# Altium footprint library ST封装.PcbLib: 1336 footprints (part 91 of 109)
Each footprint in its own frame and in the unit in brackets; x right, y up, seen from the top. Pads: shape width x height; smd on the part's side, far side on the other; paste and mask are expansions set on the pad; w line width, h text height; cw(c..) or ccw(c..) is an arc to the next point about the centre after c.
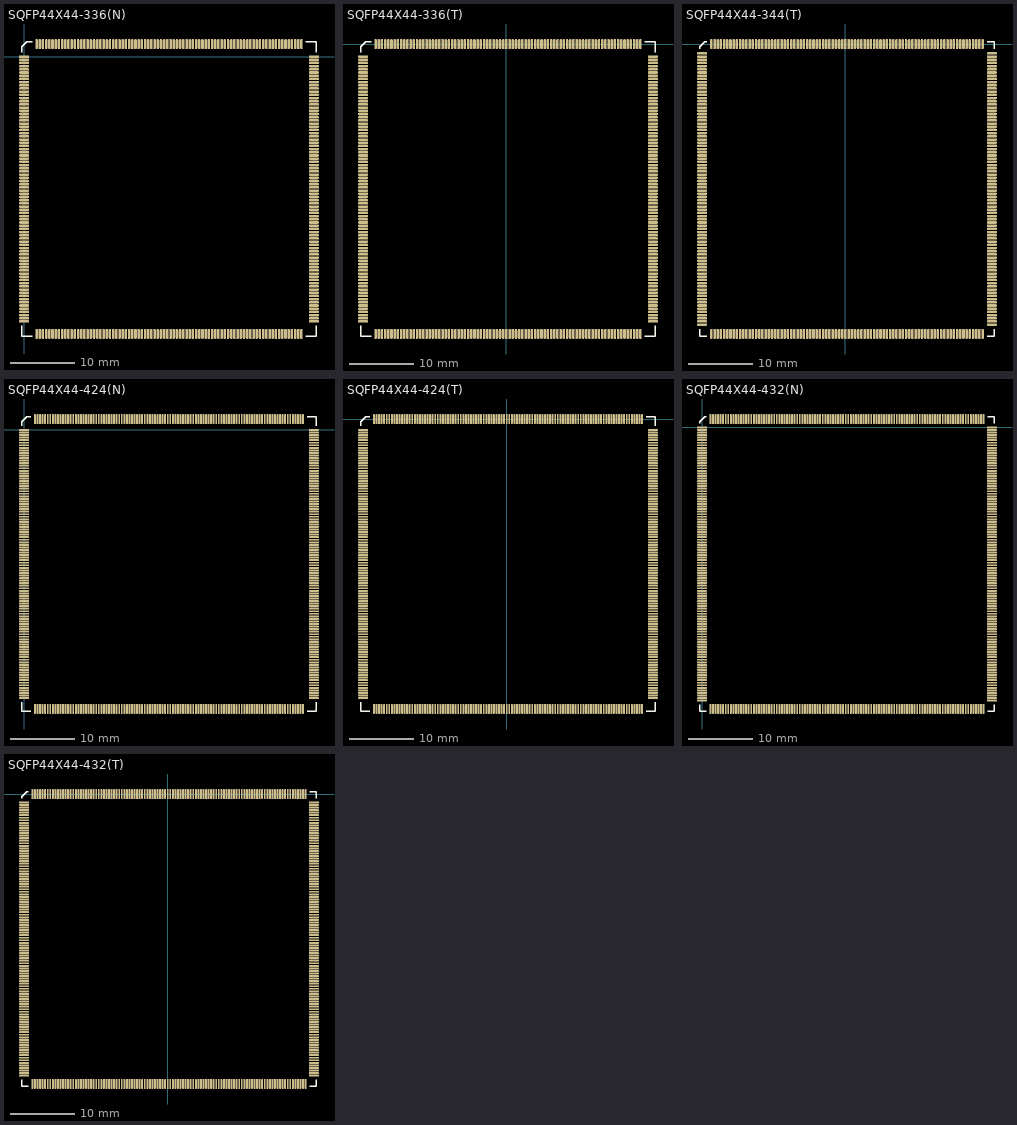
[diagram p90: the footprints below, top view; thin cyan lines are the x and y axes]

## SQFP44X44-336(N) [mm]
pads (336):
  rect 1.6x0.4 smd: 1(0,0)
  oval 1.6x0.4 smd: 2(0,-0.5) 3(0,-1) 4(0,-1.5) 5(0,-2) 6(0,-2.5) 7(0,-3) 8(0,-3.5) 9(0,-4) 10(0,-4.5) 11(0,-5) 12(0,-5.5) 13(0,-6) 14(0,-6.5) 15(0,-7) 16(0,-7.5) 17(0,-8) 18(0,-8.5) 19(0,-9) 20(0,-9.5) 21(0,-10) 22(0,-10.5) 23(0,-11) 24(0,-11.5) 25(0,-12) 26(0,-12.5) 27(0,-13) 28(0,-13.5) 29(0,-14) 30(0,-14.5) 31(0,-15) 32(0,-15.5) 33(0,-16) 34(0,-16.5) 35(0,-17) 36(0,-17.5) 37(0,-18) 38(0,-18.5) 39(0,-19) 40(0,-19.5) 41(0,-20) 42(0,-20.5) 43(0,-21) 44(0,-21.5) 45(0,-22) 46(0,-22.5) 47(0,-23) 48(0,-23.5) 49(0,-24) 50(0,-24.5) 51(0,-25) 52(0,-25.5) 53(0,-26) 54(0,-26.5) 55(0,-27) 56(0,-27.5) 57(0,-28) 58(0,-28.5) 59(0,-29) 60(0,-29.5) 61(0,-30) 62(0,-30.5) 63(0,-31) 64(0,-31.5) 65(0,-32) 66(0,-32.5) 67(0,-33) 68(0,-33.5) 69(0,-34) 70(0,-34.5) 71(0,-35) 72(0,-35.5) 73(0,-36) 74(0,-36.5) 75(0,-37) 76(0,-37.5) 77(0,-38) 78(0,-38.5) 79(0,-39) 80(0,-39.5) 81(0,-40) 82(0,-40.5) 83(0,-41) 84(0,-41.5) 169(45.4,-41.5) 170(45.4,-41) 171(45.4,-40.5) 172(45.4,-40) 173(45.4,-39.5) 174(45.4,-39) 175(45.4,-38.5) 176(45.4,-38) 177(45.4,-37.5) 178(45.4,-37) 179(45.4,-36.5) 180(45.4,-36) 181(45.4,-35.5) 182(45.4,-35) 183(45.4,-34.5) 184(45.4,-34) 185(45.4,-33.5) 186(45.4,-33) 187(45.4,-32.5) 188(45.4,-32) 189(45.4,-31.5) 190(45.4,-31) 191(45.4,-30.5) 192(45.4,-30) 193(45.4,-29.5) 194(45.4,-29) 195(45.4,-28.5) 196(45.4,-28) 197(45.4,-27.5) 198(45.4,-27) 199(45.4,-26.5) 200(45.4,-26) 201(45.4,-25.5) 202(45.4,-25) 203(45.4,-24.5) 204(45.4,-24) 205(45.4,-23.5) 206(45.4,-23) 207(45.4,-22.5) 208(45.4,-22) 209(45.4,-21.5) 210(45.4,-21) 211(45.4,-20.5) 212(45.4,-20) 213(45.4,-19.5) 214(45.4,-19) 215(45.4,-18.5) 216(45.4,-18) 217(45.4,-17.5) 218(45.4,-17) 219(45.4,-16.5) 220(45.4,-16) 221(45.4,-15.5) 222(45.4,-15) 223(45.4,-14.5) 224(45.4,-14) 225(45.4,-13.5) 226(45.4,-13) 227(45.4,-12.5) 228(45.4,-12) 229(45.4,-11.5) 230(45.4,-11) 231(45.4,-10.5) 232(45.4,-10) 233(45.4,-9.5) 234(45.4,-9) 235(45.4,-8.5) 236(45.4,-8) 237(45.4,-7.5) 238(45.4,-7) 239(45.4,-6.5) 240(45.4,-6) 241(45.4,-5.5) 242(45.4,-5) 243(45.4,-4.5) 244(45.4,-4) 245(45.4,-3.5) 246(45.4,-3) 247(45.4,-2.5) 248(45.4,-2) 249(45.4,-1.5) 250(45.4,-1) 251(45.4,-0.5) 252(45.4,0)
  oval 0.4x1.6 smd: 85(1.95,-43.45) 86(2.45,-43.45) 87(2.95,-43.45) 88(3.45,-43.45) 89(3.95,-43.45) 90(4.45,-43.45) 91(4.95,-43.45) 92(5.45,-43.45) 93(5.95,-43.45) 94(6.45,-43.45) 95(6.95,-43.45) 96(7.45,-43.45) 97(7.95,-43.45) 98(8.45,-43.45) 99(8.95,-43.45) 100(9.45,-43.45) 101(9.95,-43.45) 102(10.45,-43.45) 103(10.95,-43.45) 104(11.45,-43.45) 105(11.95,-43.45) 106(12.45,-43.45) 107(12.95,-43.45) 108(13.45,-43.45) 109(13.95,-43.45) 110(14.45,-43.45) 111(14.95,-43.45) 112(15.45,-43.45) 113(15.95,-43.45) 114(16.45,-43.45) 115(16.95,-43.45) 116(17.45,-43.45) 117(17.95,-43.45) 118(18.45,-43.45) 119(18.95,-43.45) 120(19.45,-43.45) 121(19.95,-43.45) 122(20.45,-43.45) 123(20.95,-43.45) 124(21.45,-43.45) 125(21.95,-43.45) 126(22.45,-43.45) 127(22.95,-43.45) 128(23.45,-43.45) 129(23.95,-43.45) 130(24.45,-43.45) 131(24.95,-43.45) 132(25.45,-43.45) 133(25.95,-43.45) 134(26.45,-43.45) 135(26.95,-43.45) 136(27.45,-43.45) 137(27.95,-43.45) 138(28.45,-43.45) 139(28.95,-43.45) 140(29.45,-43.45) 141(29.95,-43.45) 142(30.45,-43.45) 143(30.95,-43.45) 144(31.45,-43.45) 145(31.95,-43.45) 146(32.45,-43.45) 147(32.95,-43.45) 148(33.45,-43.45) 149(33.95,-43.45) 150(34.45,-43.45) 151(34.95,-43.45) 152(35.45,-43.45) 153(35.95,-43.45) 154(36.45,-43.45) 155(36.95,-43.45) 156(37.45,-43.45) 157(37.95,-43.45) 158(38.45,-43.45) 159(38.95,-43.45) 160(39.45,-43.45) 161(39.95,-43.45) 162(40.45,-43.45) 163(40.95,-43.45) 164(41.45,-43.45) 165(41.95,-43.45) 166(42.45,-43.45) 167(42.95,-43.45) 168(43.45,-43.45) 253(43.45,1.95) 254(42.95,1.95) 255(42.45,1.95) 256(41.95,1.95) 257(41.45,1.95) 258(40.95,1.95) 259(40.45,1.95) 260(39.95,1.95) 261(39.45,1.95) 262(38.95,1.95) 263(38.45,1.95) 264(37.95,1.95) 265(37.45,1.95) 266(36.95,1.95) 267(36.45,1.95) 268(35.95,1.95) 269(35.45,1.95) 270(34.95,1.95) 271(34.45,1.95) 272(33.95,1.95) 273(33.45,1.95) 274(32.95,1.95) 275(32.45,1.95) 276(31.95,1.95) 277(31.45,1.95) 278(30.95,1.95) 279(30.45,1.95) 280(29.95,1.95) 281(29.45,1.95) 282(28.95,1.95) 283(28.45,1.95) 284(27.95,1.95) 285(27.45,1.95) 286(26.95,1.95) 287(26.45,1.95) 288(25.95,1.95) 289(25.45,1.95) 290(24.95,1.95) 291(24.45,1.95) 292(23.95,1.95) 293(23.45,1.95) 294(22.95,1.95) 295(22.45,1.95) 296(21.95,1.95) 297(21.45,1.95) 298(20.95,1.95) 299(20.45,1.95) 300(19.95,1.95) 301(19.45,1.95) 302(18.95,1.95) 303(18.45,1.95) 304(17.95,1.95) 305(17.45,1.95) 306(16.95,1.95) 307(16.45,1.95) 308(15.95,1.95) 309(15.45,1.95) 310(14.95,1.95) 311(14.45,1.95) 312(13.95,1.95) 313(13.45,1.95) 314(12.95,1.95) 315(12.45,1.95) 316(11.95,1.95) 317(11.45,1.95) 318(10.95,1.95) 319(10.45,1.95) 320(9.95,1.95) 321(9.45,1.95) 322(8.95,1.95) 323(8.45,1.95) 324(7.95,1.95) 325(7.45,1.95) 326(6.95,1.95) 327(6.45,1.95) 328(5.95,1.95) 329(5.45,1.95) 330(4.95,1.95) 331(4.45,1.95) 332(3.95,1.95) 333(3.45,1.95) 334(2.95,1.95) 335(2.45,1.95) 336(1.95,1.95)
Top Overlay:
  lines w0.2: -0.4,-42.2 -0.4,-43.85 1.25,-43.85 ; -0.4,0.7 -0.4,1.55 0.4,2.35 1.25,2.35 ; 44.15,-43.85 45.8,-43.85 45.8,-42.2 ; 44.15,2.35 45.8,2.35 45.8,0.7

## SQFP44X44-336(T) [mm]
pads (336):
  rect 0.4x1.6 smd: 1(0,0)
  oval 0.4x1.6 smd: 2(-0.5,0) 3(-1,0) 4(-1.5,0) 5(-2,0) 6(-2.5,0) 7(-3,0) 8(-3.5,0) 9(-4,0) 10(-4.5,0) 11(-5,0) 12(-5.5,0) 13(-6,0) 14(-6.5,0) 15(-7,0) 16(-7.5,0) 17(-8,0) 18(-8.5,0) 19(-9,0) 20(-9.5,0) 21(-10,0) 22(-10.5,0) 23(-11,0) 24(-11.5,0) 25(-12,0) 26(-12.5,0) 27(-13,0) 28(-13.5,0) 29(-14,0) 30(-14.5,0) 31(-15,0) 32(-15.5,0) 33(-16,0) 34(-16.5,0) 35(-17,0) 36(-17.5,0) 37(-18,0) 38(-18.5,0) 39(-19,0) 40(-19.5,0) 41(-20,0) 42(-20.5,0) 127(-20.5,-45.4) 128(-20,-45.4) 129(-19.5,-45.4) 130(-19,-45.4) 131(-18.5,-45.4) 132(-18,-45.4) 133(-17.5,-45.4) 134(-17,-45.4) 135(-16.5,-45.4) 136(-16,-45.4) 137(-15.5,-45.4) 138(-15,-45.4) 139(-14.5,-45.4) 140(-14,-45.4) 141(-13.5,-45.4) 142(-13,-45.4) 143(-12.5,-45.4) 144(-12,-45.4) 145(-11.5,-45.4) 146(-11,-45.4) 147(-10.5,-45.4) 148(-10,-45.4) 149(-9.5,-45.4) 150(-9,-45.4) 151(-8.5,-45.4) 152(-8,-45.4) 153(-7.5,-45.4) 154(-7,-45.4) 155(-6.5,-45.4) 156(-6,-45.4) 157(-5.5,-45.4) 158(-5,-45.4) 159(-4.5,-45.4) 160(-4,-45.4) 161(-3.5,-45.4) 162(-3,-45.4) 163(-2.5,-45.4) 164(-2,-45.4) 165(-1.5,-45.4) 166(-1,-45.4) 167(-0.5,-45.4) 168(0,-45.4) 169(0.5,-45.4) 170(1,-45.4) 171(1.5,-45.4) 172(2,-45.4) 173(2.5,-45.4) 174(3,-45.4) 175(3.5,-45.4) 176(4,-45.4) 177(4.5,-45.4) 178(5,-45.4) 179(5.5,-45.4) 180(6,-45.4) 181(6.5,-45.4) 182(7,-45.4) 183(7.5,-45.4) 184(8,-45.4) 185(8.5,-45.4) 186(9,-45.4) 187(9.5,-45.4) 188(10,-45.4) 189(10.5,-45.4) 190(11,-45.4) 191(11.5,-45.4) 192(12,-45.4) 193(12.5,-45.4) 194(13,-45.4) 195(13.5,-45.4) 196(14,-45.4) 197(14.5,-45.4) 198(15,-45.4) 199(15.5,-45.4) 200(16,-45.4) 201(16.5,-45.4) 202(17,-45.4) 203(17.5,-45.4) 204(18,-45.4) 205(18.5,-45.4) 206(19,-45.4) 207(19.5,-45.4) 208(20,-45.4) 209(20.5,-45.4) 210(21,-45.4) 295(21,0) 296(20.5,0) 297(20,0) 298(19.5,0) 299(19,0) 300(18.5,0) 301(18,0) 302(17.5,0) 303(17,0) 304(16.5,0) 305(16,0) 306(15.5,0) 307(15,0) 308(14.5,0) 309(14,0) 310(13.5,0) 311(13,0) 312(12.5,0) 313(12,0) 314(11.5,0) 315(11,0) 316(10.5,0) 317(10,0) 318(9.5,0) 319(9,0) 320(8.5,0) 321(8,0) 322(7.5,0) 323(7,0) 324(6.5,0) 325(6,0) 326(5.5,0) 327(5,0) 328(4.5,0) 329(4,0) 330(3.5,0) 331(3,0) 332(2.5,0) 333(2,0) 334(1.5,0) 335(1,0) 336(0.5,0)
  oval 1.6x0.4 smd: 43(-22.45,-1.95) 44(-22.45,-2.45) 45(-22.45,-2.95) 46(-22.45,-3.45) 47(-22.45,-3.95) 48(-22.45,-4.45) 49(-22.45,-4.95) 50(-22.45,-5.45) 51(-22.45,-5.95) 52(-22.45,-6.45) 53(-22.45,-6.95) 54(-22.45,-7.45) 55(-22.45,-7.95) 56(-22.45,-8.45) 57(-22.45,-8.95) 58(-22.45,-9.45) 59(-22.45,-9.95) 60(-22.45,-10.45) 61(-22.45,-10.95) 62(-22.45,-11.45) 63(-22.45,-11.95) 64(-22.45,-12.45) 65(-22.45,-12.95) 66(-22.45,-13.45) 67(-22.45,-13.95) 68(-22.45,-14.45) 69(-22.45,-14.95) 70(-22.45,-15.45) 71(-22.45,-15.95) 72(-22.45,-16.45) 73(-22.45,-16.95) 74(-22.45,-17.45) 75(-22.45,-17.95) 76(-22.45,-18.45) 77(-22.45,-18.95) 78(-22.45,-19.45) 79(-22.45,-19.95) 80(-22.45,-20.45) 81(-22.45,-20.95) 82(-22.45,-21.45) 83(-22.45,-21.95) 84(-22.45,-22.45) 85(-22.45,-22.95) 86(-22.45,-23.45) 87(-22.45,-23.95) 88(-22.45,-24.45) 89(-22.45,-24.95) 90(-22.45,-25.45) 91(-22.45,-25.95) 92(-22.45,-26.45) 93(-22.45,-26.95) 94(-22.45,-27.45) 95(-22.45,-27.95) 96(-22.45,-28.45) 97(-22.45,-28.95) 98(-22.45,-29.45) 99(-22.45,-29.95) 100(-22.45,-30.45) 101(-22.45,-30.95) 102(-22.45,-31.45) 103(-22.45,-31.95) 104(-22.45,-32.45) 105(-22.45,-32.95) 106(-22.45,-33.45) 107(-22.45,-33.95) 108(-22.45,-34.45) 109(-22.45,-34.95) 110(-22.45,-35.45) 111(-22.45,-35.95) 112(-22.45,-36.45) 113(-22.45,-36.95) 114(-22.45,-37.45) 115(-22.45,-37.95) 116(-22.45,-38.45) 117(-22.45,-38.95) 118(-22.45,-39.45) 119(-22.45,-39.95) 120(-22.45,-40.45) 121(-22.45,-40.95) 122(-22.45,-41.45) 123(-22.45,-41.95) 124(-22.45,-42.45) 125(-22.45,-42.95) 126(-22.45,-43.45) 211(22.95,-43.45) 212(22.95,-42.95) 213(22.95,-42.45) 214(22.95,-41.95) 215(22.95,-41.45) 216(22.95,-40.95) 217(22.95,-40.45) 218(22.95,-39.95) 219(22.95,-39.45) 220(22.95,-38.95) 221(22.95,-38.45) 222(22.95,-37.95) 223(22.95,-37.45) 224(22.95,-36.95) 225(22.95,-36.45) 226(22.95,-35.95) 227(22.95,-35.45) 228(22.95,-34.95) 229(22.95,-34.45) 230(22.95,-33.95) 231(22.95,-33.45) 232(22.95,-32.95) 233(22.95,-32.45) 234(22.95,-31.95) 235(22.95,-31.45) 236(22.95,-30.95) 237(22.95,-30.45) 238(22.95,-29.95) 239(22.95,-29.45) 240(22.95,-28.95) 241(22.95,-28.45) 242(22.95,-27.95) 243(22.95,-27.45) 244(22.95,-26.95) 245(22.95,-26.45) 246(22.95,-25.95) 247(22.95,-25.45) 248(22.95,-24.95) 249(22.95,-24.45) 250(22.95,-23.95) 251(22.95,-23.45) 252(22.95,-22.95) 253(22.95,-22.45) 254(22.95,-21.95) 255(22.95,-21.45) 256(22.95,-20.95) 257(22.95,-20.45) 258(22.95,-19.95) 259(22.95,-19.45) 260(22.95,-18.95) 261(22.95,-18.45) 262(22.95,-17.95) 263(22.95,-17.45) 264(22.95,-16.95) 265(22.95,-16.45) 266(22.95,-15.95) 267(22.95,-15.45) 268(22.95,-14.95) 269(22.95,-14.45) 270(22.95,-13.95) 271(22.95,-13.45) 272(22.95,-12.95) 273(22.95,-12.45) 274(22.95,-11.95) 275(22.95,-11.45) 276(22.95,-10.95) 277(22.95,-10.45) 278(22.95,-9.95) 279(22.95,-9.45) 280(22.95,-8.95) 281(22.95,-8.45) 282(22.95,-7.95) 283(22.95,-7.45) 284(22.95,-6.95) 285(22.95,-6.45) 286(22.95,-5.95) 287(22.95,-5.45) 288(22.95,-4.95) 289(22.95,-4.45) 290(22.95,-3.95) 291(22.95,-3.45) 292(22.95,-2.95) 293(22.95,-2.45) 294(22.95,-1.95)
Top Overlay:
  lines w0.2: -22.85,-44.15 -22.85,-45.8 -21.2,-45.8 ; -22.85,-1.25 -22.85,-0.4 -22.05,0.4 -21.2,0.4 ; 21.7,-45.8 23.35,-45.8 23.35,-44.15 ; 21.7,0.4 23.35,0.4 23.35,-1.25

## SQFP44X44-344(T) [mm]
pads (344):
  rect 0.4x1.6 smd: 1(0,0)
  oval 0.4x1.6 smd: 2(-0.5,0) 3(-1,0) 4(-1.5,0) 5(-2,0) 6(-2.5,0) 7(-3,0) 8(-3.5,0) 9(-4,0) 10(-4.5,0) 11(-5,0) 12(-5.5,0) 13(-6,0) 14(-6.5,0) 15(-7,0) 16(-7.5,0) 17(-8,0) 18(-8.5,0) 19(-9,0) 20(-9.5,0) 21(-10,0) 22(-10.5,0) 23(-11,0) 24(-11.5,0) 25(-12,0) 26(-12.5,0) 27(-13,0) 28(-13.5,0) 29(-14,0) 30(-14.5,0) 31(-15,0) 32(-15.5,0) 33(-16,0) 34(-16.5,0) 35(-17,0) 36(-17.5,0) 37(-18,0) 38(-18.5,0) 39(-19,0) 40(-19.5,0) 41(-20,0) 42(-20.5,0) 43(-21,0) 130(-21,-45.4) 131(-20.5,-45.4) 132(-20,-45.4) 133(-19.5,-45.4) 134(-19,-45.4) 135(-18.5,-45.4) 136(-18,-45.4) 137(-17.5,-45.4) 138(-17,-45.4) 139(-16.5,-45.4) 140(-16,-45.4) 141(-15.5,-45.4) 142(-15,-45.4) 143(-14.5,-45.4) 144(-14,-45.4) 145(-13.5,-45.4) 146(-13,-45.4) 147(-12.5,-45.4) 148(-12,-45.4) 149(-11.5,-45.4) 150(-11,-45.4) 151(-10.5,-45.4) 152(-10,-45.4) 153(-9.5,-45.4) 154(-9,-45.4) 155(-8.5,-45.4) 156(-8,-45.4) 157(-7.5,-45.4) 158(-7,-45.4) 159(-6.5,-45.4) 160(-6,-45.4) 161(-5.5,-45.4) 162(-5,-45.4) 163(-4.5,-45.4) 164(-4,-45.4) 165(-3.5,-45.4) 166(-3,-45.4) 167(-2.5,-45.4) 168(-2,-45.4) 169(-1.5,-45.4) 170(-1,-45.4) 171(-0.5,-45.4) 172(0,-45.4) 173(0.5,-45.4) 174(1,-45.4) 175(1.5,-45.4) 176(2,-45.4) 177(2.5,-45.4) 178(3,-45.4) 179(3.5,-45.4) 180(4,-45.4) 181(4.5,-45.4) 182(5,-45.4) 183(5.5,-45.4) 184(6,-45.4) 185(6.5,-45.4) 186(7,-45.4) 187(7.5,-45.4) 188(8,-45.4) 189(8.5,-45.4) 190(9,-45.4) 191(9.5,-45.4) 192(10,-45.4) 193(10.5,-45.4) 194(11,-45.4) 195(11.5,-45.4) 196(12,-45.4) 197(12.5,-45.4) 198(13,-45.4) 199(13.5,-45.4) 200(14,-45.4) 201(14.5,-45.4) 202(15,-45.4) 203(15.5,-45.4) 204(16,-45.4) 205(16.5,-45.4) 206(17,-45.4) 207(17.5,-45.4) 208(18,-45.4) 209(18.5,-45.4) 210(19,-45.4) 211(19.5,-45.4) 212(20,-45.4) 213(20.5,-45.4) 214(21,-45.4) 215(21.5,-45.4) 302(21.5,0) 303(21,0) 304(20.5,0) 305(20,0) 306(19.5,0) 307(19,0) 308(18.5,0) 309(18,0) 310(17.5,0) 311(17,0) 312(16.5,0) 313(16,0) 314(15.5,0) 315(15,0) 316(14.5,0) 317(14,0) 318(13.5,0) 319(13,0) 320(12.5,0) 321(12,0) 322(11.5,0) 323(11,0) 324(10.5,0) 325(10,0) 326(9.5,0) 327(9,0) 328(8.5,0) 329(8,0) 330(7.5,0) 331(7,0) 332(6.5,0) 333(6,0) 334(5.5,0) 335(5,0) 336(4.5,0) 337(4,0) 338(3.5,0) 339(3,0) 340(2.5,0) 341(2,0) 342(1.5,0) 343(1,0) 344(0.5,0)
  oval 1.6x0.4 smd: 44(-22.45,-1.45) 45(-22.45,-1.95) 46(-22.45,-2.45) 47(-22.45,-2.95) 48(-22.45,-3.45) 49(-22.45,-3.95) 50(-22.45,-4.45) 51(-22.45,-4.95) 52(-22.45,-5.45) 53(-22.45,-5.95) 54(-22.45,-6.45) 55(-22.45,-6.95) 56(-22.45,-7.45) 57(-22.45,-7.95) 58(-22.45,-8.45) 59(-22.45,-8.95) 60(-22.45,-9.45) 61(-22.45,-9.95) 62(-22.45,-10.45) 63(-22.45,-10.95) 64(-22.45,-11.45) 65(-22.45,-11.95) 66(-22.45,-12.45) 67(-22.45,-12.95) 68(-22.45,-13.45) 69(-22.45,-13.95) 70(-22.45,-14.45) 71(-22.45,-14.95) 72(-22.45,-15.45) 73(-22.45,-15.95) 74(-22.45,-16.45) 75(-22.45,-16.95) 76(-22.45,-17.45) 77(-22.45,-17.95) 78(-22.45,-18.45) 79(-22.45,-18.95) 80(-22.45,-19.45) 81(-22.45,-19.95) 82(-22.45,-20.45) 83(-22.45,-20.95) 84(-22.45,-21.45) 85(-22.45,-21.95) 86(-22.45,-22.45) 87(-22.45,-22.95) 88(-22.45,-23.45) 89(-22.45,-23.95) 90(-22.45,-24.45) 91(-22.45,-24.95) 92(-22.45,-25.45) 93(-22.45,-25.95) 94(-22.45,-26.45) 95(-22.45,-26.95) 96(-22.45,-27.45) 97(-22.45,-27.95) 98(-22.45,-28.45) 99(-22.45,-28.95) 100(-22.45,-29.45) 101(-22.45,-29.95) 102(-22.45,-30.45) 103(-22.45,-30.95) 104(-22.45,-31.45) 105(-22.45,-31.95) 106(-22.45,-32.45) 107(-22.45,-32.95) 108(-22.45,-33.45) 109(-22.45,-33.95) 110(-22.45,-34.45) 111(-22.45,-34.95) 112(-22.45,-35.45) 113(-22.45,-35.95) 114(-22.45,-36.45) 115(-22.45,-36.95) 116(-22.45,-37.45) 117(-22.45,-37.95) 118(-22.45,-38.45) 119(-22.45,-38.95) 120(-22.45,-39.45) 121(-22.45,-39.95) 122(-22.45,-40.45) 123(-22.45,-40.95) 124(-22.45,-41.45) 125(-22.45,-41.95) 126(-22.45,-42.45) 127(-22.45,-42.95) 128(-22.45,-43.45) 129(-22.45,-43.95) 216(22.95,-43.95) 217(22.95,-43.45) 218(22.95,-42.95) 219(22.95,-42.45) 220(22.95,-41.95) 221(22.95,-41.45) 222(22.95,-40.95) 223(22.95,-40.45) 224(22.95,-39.95) 225(22.95,-39.45) 226(22.95,-38.95) 227(22.95,-38.45) 228(22.95,-37.95) 229(22.95,-37.45) 230(22.95,-36.95) 231(22.95,-36.45) 232(22.95,-35.95) 233(22.95,-35.45) 234(22.95,-34.95) 235(22.95,-34.45) 236(22.95,-33.95) 237(22.95,-33.45) 238(22.95,-32.95) 239(22.95,-32.45) 240(22.95,-31.95) 241(22.95,-31.45) 242(22.95,-30.95) 243(22.95,-30.45) 244(22.95,-29.95) 245(22.95,-29.45) 246(22.95,-28.95) 247(22.95,-28.45) 248(22.95,-27.95) 249(22.95,-27.45) 250(22.95,-26.95) 251(22.95,-26.45) 252(22.95,-25.95) 253(22.95,-25.45) 254(22.95,-24.95) 255(22.95,-24.45) 256(22.95,-23.95) 257(22.95,-23.45) 258(22.95,-22.95) 259(22.95,-22.45) 260(22.95,-21.95) 261(22.95,-21.45) 262(22.95,-20.95) 263(22.95,-20.45) 264(22.95,-19.95) 265(22.95,-19.45) 266(22.95,-18.95) 267(22.95,-18.45) 268(22.95,-17.95) 269(22.95,-17.45) 270(22.95,-16.95) 271(22.95,-16.45) 272(22.95,-15.95) 273(22.95,-15.45) 274(22.95,-14.95) 275(22.95,-14.45) 276(22.95,-13.95) 277(22.95,-13.45) 278(22.95,-12.95) 279(22.95,-12.45) 280(22.95,-11.95) 281(22.95,-11.45) 282(22.95,-10.95) 283(22.95,-10.45) 284(22.95,-9.95) 285(22.95,-9.45) 286(22.95,-8.95) 287(22.95,-8.45) 288(22.95,-7.95) 289(22.95,-7.45) 290(22.95,-6.95) 291(22.95,-6.45) 292(22.95,-5.95) 293(22.95,-5.45) 294(22.95,-4.95) 295(22.95,-4.45) 296(22.95,-3.95) 297(22.95,-3.45) 298(22.95,-2.95) 299(22.95,-2.45) 300(22.95,-1.95) 301(22.95,-1.45)
Top Overlay:
  lines w0.2: -22.85,-44.65 -22.85,-45.8 -21.7,-45.8 ; -22.85,-0.75 -22.85,-0.4 -22.05,0.4 -21.7,0.4 ; 22.2,-45.8 23.35,-45.8 23.35,-44.65 ; 22.2,0.4 23.35,0.4 23.35,-0.75

## SQFP44X44-424(N) [mm]
pads (424):
  rect 1.6x0.3 smd: 1(0,0)
  oval 1.6x0.3 smd: 2(0,-0.4) 3(0,-0.8) 4(0,-1.2) 5(0,-1.6) 6(0,-2) 7(0,-2.4) 8(0,-2.8) 9(0,-3.2) 10(0,-3.6) 11(0,-4) 12(0,-4.4) 13(0,-4.8) 14(0,-5.2) 15(0,-5.6) 16(0,-6) 17(0,-6.4) 18(0,-6.8) 19(0,-7.2) 20(0,-7.6) 21(0,-8) 22(0,-8.4) 23(0,-8.8) 24(0,-9.2) 25(0,-9.6) 26(0,-10) 27(0,-10.4) 28(0,-10.8) 29(0,-11.2) 30(0,-11.6) 31(0,-12) 32(0,-12.4) 33(0,-12.8) 34(0,-13.2) 35(0,-13.6) 36(0,-14) 37(0,-14.4) 38(0,-14.8) 39(0,-15.2) 40(0,-15.6) 41(0,-16) 42(0,-16.4) 43(0,-16.8) 44(0,-17.2) 45(0,-17.6) 46(0,-18) 47(0,-18.4) 48(0,-18.8) 49(0,-19.2) 50(0,-19.6) 51(0,-20) 52(0,-20.4) 53(0,-20.8) 54(0,-21.2) 55(0,-21.6) 56(0,-22) 57(0,-22.4) 58(0,-22.8) 59(0,-23.2) 60(0,-23.6) 61(0,-24) 62(0,-24.4) 63(0,-24.8) 64(0,-25.2) 65(0,-25.6) 66(0,-26) 67(0,-26.4) 68(0,-26.8) 69(0,-27.2) 70(0,-27.6) 71(0,-28) 72(0,-28.4) 73(0,-28.8) 74(0,-29.2) 75(0,-29.6) 76(0,-30) 77(0,-30.4) 78(0,-30.8) 79(0,-31.2) 80(0,-31.6) 81(0,-32) 82(0,-32.4) 83(0,-32.8) 84(0,-33.2) 85(0,-33.6) 86(0,-34) 87(0,-34.4) 88(0,-34.8) 89(0,-35.2) 90(0,-35.6) 91(0,-36) 92(0,-36.4) 93(0,-36.8) 94(0,-37.2) 95(0,-37.6) 96(0,-38) 97(0,-38.4) 98(0,-38.8) 99(0,-39.2) 100(0,-39.6) 101(0,-40) 102(0,-40.4) 103(0,-40.8) 104(0,-41.2) 105(0,-41.6) 106(0,-42) 213(45.4,-42) 214(45.4,-41.6) 215(45.4,-41.2) 216(45.4,-40.8) 217(45.4,-40.4) 218(45.4,-40) 219(45.4,-39.6) 220(45.4,-39.2) 221(45.4,-38.8) 222(45.4,-38.4) 223(45.4,-38) 224(45.4,-37.6) 225(45.4,-37.2) 226(45.4,-36.8) 227(45.4,-36.4) 228(45.4,-36) 229(45.4,-35.6) 230(45.4,-35.2) 231(45.4,-34.8) 232(45.4,-34.4) 233(45.4,-34) 234(45.4,-33.6) 235(45.4,-33.2) 236(45.4,-32.8) 237(45.4,-32.4) 238(45.4,-32) 239(45.4,-31.6) 240(45.4,-31.2) 241(45.4,-30.8) 242(45.4,-30.4) 243(45.4,-30) 244(45.4,-29.6) 245(45.4,-29.2) 246(45.4,-28.8) 247(45.4,-28.4) 248(45.4,-28) 249(45.4,-27.6) 250(45.4,-27.2) 251(45.4,-26.8) 252(45.4,-26.4) 253(45.4,-26) 254(45.4,-25.6) 255(45.4,-25.2) 256(45.4,-24.8) 257(45.4,-24.4) 258(45.4,-24) 259(45.4,-23.6) 260(45.4,-23.2) 261(45.4,-22.8) 262(45.4,-22.4) 263(45.4,-22) 264(45.4,-21.6) 265(45.4,-21.2) 266(45.4,-20.8) 267(45.4,-20.4) 268(45.4,-20) 269(45.4,-19.6) 270(45.4,-19.2) 271(45.4,-18.8) 272(45.4,-18.4) 273(45.4,-18) 274(45.4,-17.6) 275(45.4,-17.2) 276(45.4,-16.8) 277(45.4,-16.4) 278(45.4,-16) 279(45.4,-15.6) 280(45.4,-15.2) 281(45.4,-14.8) 282(45.4,-14.4) 283(45.4,-14) 284(45.4,-13.6) 285(45.4,-13.2) 286(45.4,-12.8) 287(45.4,-12.4) 288(45.4,-12) 289(45.4,-11.6) 290(45.4,-11.2) 291(45.4,-10.8) 292(45.4,-10.4) 293(45.4,-10) 294(45.4,-9.6) 295(45.4,-9.2) 296(45.4,-8.8) 297(45.4,-8.4) 298(45.4,-8) 299(45.4,-7.6) 300(45.4,-7.2) 301(45.4,-6.8) 302(45.4,-6.4) 303(45.4,-6) 304(45.4,-5.6) 305(45.4,-5.2) 306(45.4,-4.8) 307(45.4,-4.4) 308(45.4,-4) 309(45.4,-3.6) 310(45.4,-3.2) 311(45.4,-2.8) 312(45.4,-2.4) 313(45.4,-2) 314(45.4,-1.6) 315(45.4,-1.2) 316(45.4,-0.8) 317(45.4,-0.4) 318(45.4,0)
  oval 0.3x1.6 smd: 107(1.7,-43.7) 108(2.1,-43.7) 109(2.5,-43.7) 110(2.9,-43.7) 111(3.3,-43.7) 112(3.7,-43.7) 113(4.1,-43.7) 114(4.5,-43.7) 115(4.9,-43.7) 116(5.3,-43.7) 117(5.7,-43.7) 118(6.1,-43.7) 119(6.5,-43.7) 120(6.9,-43.7) 121(7.3,-43.7) 122(7.7,-43.7) 123(8.1,-43.7) 124(8.5,-43.7) 125(8.9,-43.7) 126(9.3,-43.7) 127(9.7,-43.7) 128(10.1,-43.7) 129(10.5,-43.7) 130(10.9,-43.7) 131(11.3,-43.7) 132(11.7,-43.7) 133(12.1,-43.7) 134(12.5,-43.7) 135(12.9,-43.7) 136(13.3,-43.7) 137(13.7,-43.7) 138(14.1,-43.7) 139(14.5,-43.7) 140(14.9,-43.7) 141(15.3,-43.7) 142(15.7,-43.7) 143(16.1,-43.7) 144(16.5,-43.7) 145(16.9,-43.7) 146(17.3,-43.7) 147(17.7,-43.7) 148(18.1,-43.7) 149(18.5,-43.7) 150(18.9,-43.7) 151(19.3,-43.7) 152(19.7,-43.7) 153(20.1,-43.7) 154(20.5,-43.7) 155(20.9,-43.7) 156(21.3,-43.7) 157(21.7,-43.7) 158(22.1,-43.7) 159(22.5,-43.7) 160(22.9,-43.7) 161(23.3,-43.7) 162(23.7,-43.7) 163(24.1,-43.7) 164(24.5,-43.7) 165(24.9,-43.7) 166(25.3,-43.7) 167(25.7,-43.7) 168(26.1,-43.7) 169(26.5,-43.7) 170(26.9,-43.7) 171(27.3,-43.7) 172(27.7,-43.7) 173(28.1,-43.7) 174(28.5,-43.7) 175(28.9,-43.7) 176(29.3,-43.7) 177(29.7,-43.7) 178(30.1,-43.7) 179(30.5,-43.7) 180(30.9,-43.7) 181(31.3,-43.7) 182(31.7,-43.7) 183(32.1,-43.7) 184(32.5,-43.7) 185(32.9,-43.7) 186(33.3,-43.7) 187(33.7,-43.7) 188(34.1,-43.7) 189(34.5,-43.7) 190(34.9,-43.7) 191(35.3,-43.7) 192(35.7,-43.7) 193(36.1,-43.7) 194(36.5,-43.7) 195(36.9,-43.7) 196(37.3,-43.7) 197(37.7,-43.7) 198(38.1,-43.7) 199(38.5,-43.7) 200(38.9,-43.7) 201(39.3,-43.7) 202(39.7,-43.7) 203(40.1,-43.7) 204(40.5,-43.7) 205(40.9,-43.7) 206(41.3,-43.7) 207(41.7,-43.7) 208(42.1,-43.7) 209(42.5,-43.7) 210(42.9,-43.7) 211(43.3,-43.7) 212(43.7,-43.7) 319(43.7,1.7) 320(43.3,1.7) 321(42.9,1.7) 322(42.5,1.7) 323(42.1,1.7) 324(41.7,1.7) 325(41.3,1.7) 326(40.9,1.7) 327(40.5,1.7) 328(40.1,1.7) 329(39.7,1.7) 330(39.3,1.7) 331(38.9,1.7) 332(38.5,1.7) 333(38.1,1.7) 334(37.7,1.7) 335(37.3,1.7) 336(36.9,1.7) 337(36.5,1.7) 338(36.1,1.7) 339(35.7,1.7) 340(35.3,1.7) 341(34.9,1.7) 342(34.5,1.7) 343(34.1,1.7) 344(33.7,1.7) 345(33.3,1.7) 346(32.9,1.7) 347(32.5,1.7) 348(32.1,1.7) 349(31.7,1.7) 350(31.3,1.7) 351(30.9,1.7) 352(30.5,1.7) 353(30.1,1.7) 354(29.7,1.7) 355(29.3,1.7) 356(28.9,1.7) 357(28.5,1.7) 358(28.1,1.7) 359(27.7,1.7) 360(27.3,1.7) 361(26.9,1.7) 362(26.5,1.7) 363(26.1,1.7) 364(25.7,1.7) 365(25.3,1.7) 366(24.9,1.7) 367(24.5,1.7) 368(24.1,1.7) 369(23.7,1.7) 370(23.3,1.7) 371(22.9,1.7) 372(22.5,1.7) 373(22.1,1.7) 374(21.7,1.7) 375(21.3,1.7) 376(20.9,1.7) 377(20.5,1.7) 378(20.1,1.7) 379(19.7,1.7) 380(19.3,1.7) 381(18.9,1.7) 382(18.5,1.7) 383(18.1,1.7) 384(17.7,1.7) 385(17.3,1.7) 386(16.9,1.7) 387(16.5,1.7) 388(16.1,1.7) 389(15.7,1.7) 390(15.3,1.7) 391(14.9,1.7) 392(14.5,1.7) 393(14.1,1.7) 394(13.7,1.7) 395(13.3,1.7) 396(12.9,1.7) 397(12.5,1.7) 398(12.1,1.7) 399(11.7,1.7) 400(11.3,1.7) 401(10.9,1.7) 402(10.5,1.7) 403(10.1,1.7) 404(9.7,1.7) 405(9.3,1.7) 406(8.9,1.7) 407(8.5,1.7) 408(8.1,1.7) 409(7.7,1.7) 410(7.3,1.7) 411(6.9,1.7) 412(6.5,1.7) 413(6.1,1.7) 414(5.7,1.7) 415(5.3,1.7) 416(4.9,1.7) 417(4.5,1.7) 418(4.1,1.7) 419(3.7,1.7) 420(3.3,1.7) 421(2.9,1.7) 422(2.5,1.7) 423(2.1,1.7) 424(1.7,1.7)